# Altium footprint library Connector_PinHeader_2.00mm.PcbLib: 278 footprints (part 10 of 18)
Each footprint in its own frame and in the unit in brackets; x right, y up, seen from the top. Pads: shape width x height; smd on the part's side, far side on the other; paste and mask are expansions set on the pad; w line width, h text height; cw(c..) or ccw(c..) is an arc to the next point about the centre after c.
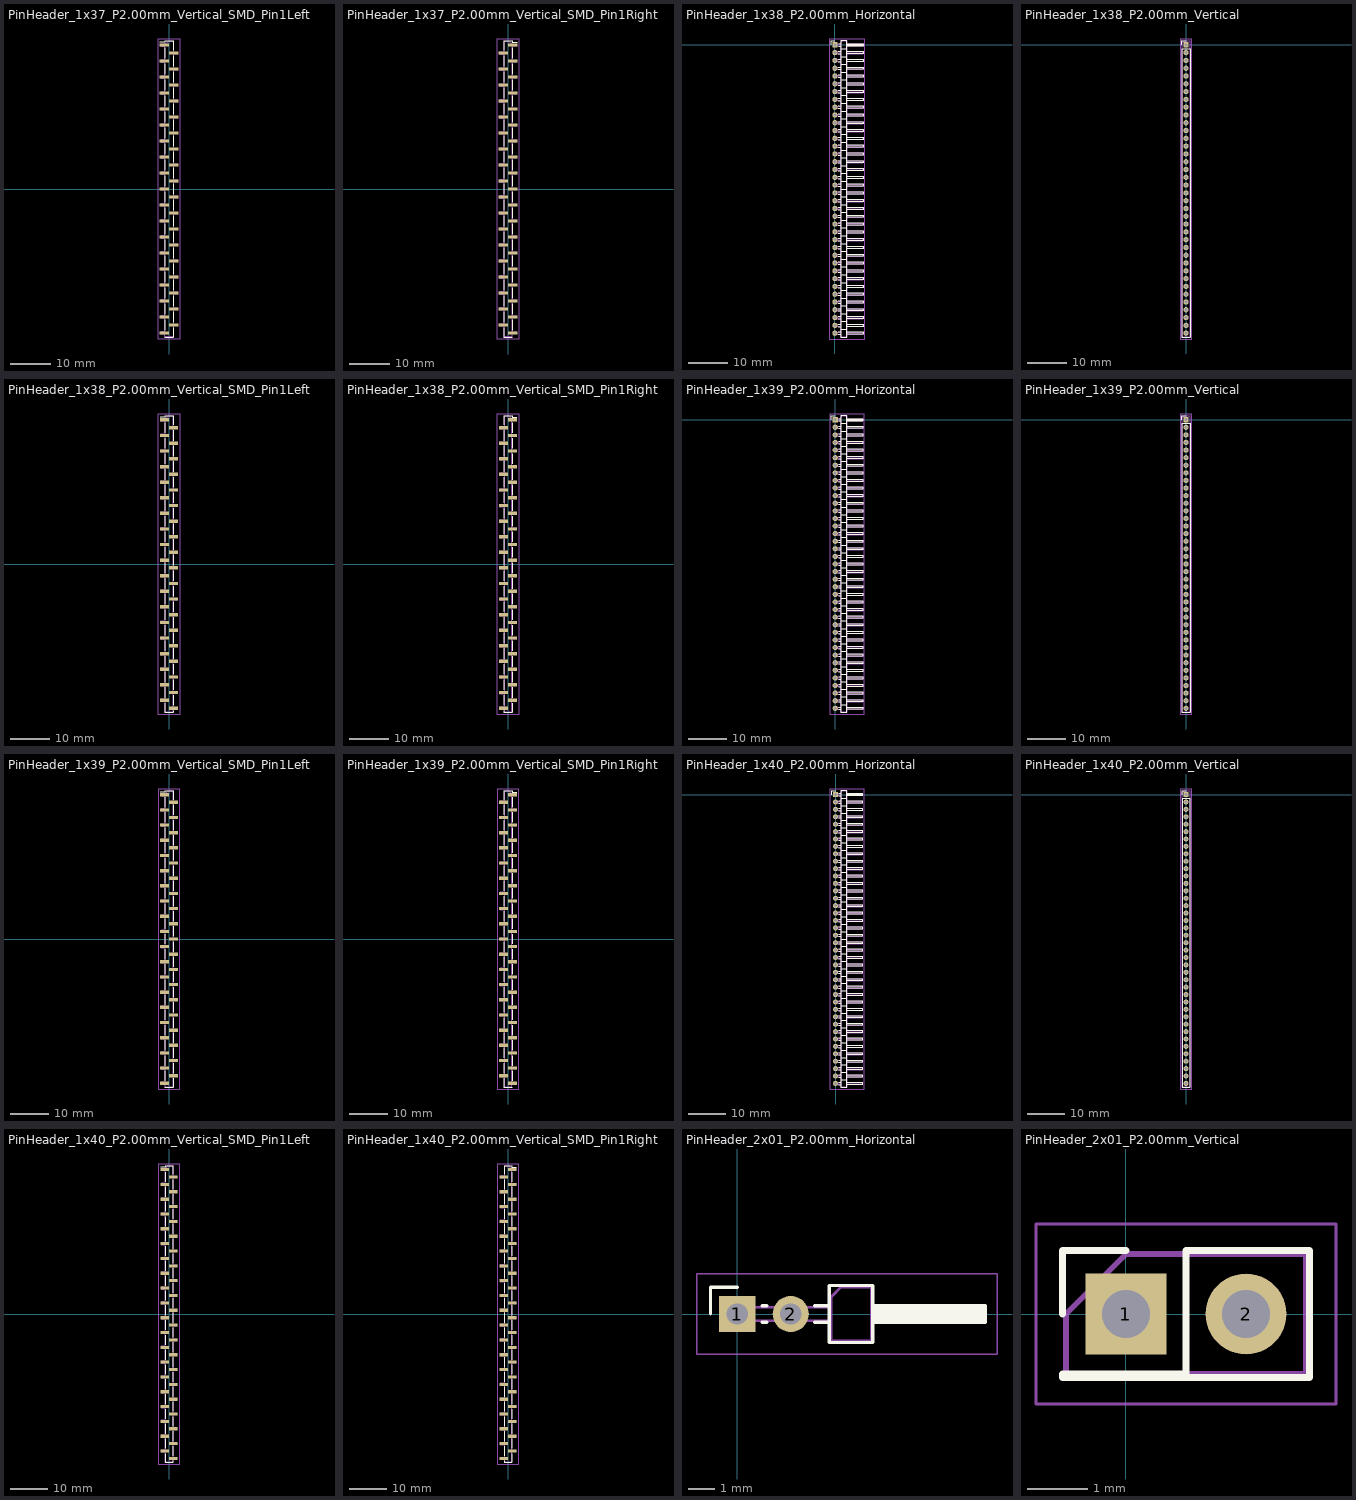
[diagram p9: the footprints below, top view; thin cyan lines are the x and y axes]

## PinHeader_1x37_P2.00mm_Vertical_SMD_Pin1Left [mm]
pads (37):
  rect 2.35x0.85 smd: 1(-1.175,36) 2(1.175,34) 3(-1.175,32) 4(1.175,30) 5(-1.175,28) 6(1.175,26) 7(-1.175,24) 8(1.175,22) 9(-1.175,20) 10(1.175,18) 11(-1.175,16) 12(1.175,14) 13(-1.175,12) 14(1.175,10) 15(-1.175,8) 16(1.175,6) 17(-1.175,4) 18(1.175,2) 19(-1.175,0) 20(1.175,-2) 21(-1.175,-4) 22(1.175,-6) 23(-1.175,-8) 24(1.175,-10) 25(-1.175,-12) 26(1.175,-14) 27(-1.175,-16) 28(1.175,-18) 29(-1.175,-20) 30(1.175,-22) 31(-1.175,-24) 32(1.175,-26) 33(-1.175,-28) 34(1.175,-30) 35(-1.175,-32) 36(1.175,-34) 37(-1.175,-36)
F.SilkS:
  lines w0.12: -2.29,36.685 -1.06,36.685 -1.06,37.06 1.06,37.06 1.06,34.685 ; -1.06,-37.06 1.06,-37.06 ; -1.06,-35.315 -1.06,-32.685 ; -1.06,-31.315 -1.06,-28.685 ; -1.06,-27.315 -1.06,-24.685 ; -1.06,-23.315 -1.06,-20.685 ; -1.06,-19.315 -1.06,-16.685 ; -1.06,-15.315 -1.06,-12.685 ; -1.06,-11.315 -1.06,-8.685 ; -1.06,-7.315 -1.06,-4.685 ; -1.06,-3.315 -1.06,-0.685 ; -1.06,0.685 -1.06,3.315 ; -1.06,4.685 -1.06,7.315 ; -1.06,8.685 -1.06,11.315 ; -1.06,12.685 -1.06,15.315 ; -1.06,16.685 -1.06,19.315 ; -1.06,20.685 -1.06,23.315 ; -1.06,24.685 -1.06,27.315 ; -1.06,28.685 -1.06,31.315 ; -1.06,32.685 -1.06,35.315 ; 1.06,-36.685 1.06,-37.06 ; 1.06,-34.685 1.06,-37.06 ; 1.06,-33.315 1.06,-30.685 ; 1.06,-29.315 1.06,-26.685 ; 1.06,-25.315 1.06,-22.685 ; 1.06,-21.315 1.06,-18.685 ; 1.06,-17.315 1.06,-14.685 ; 1.06,-13.315 1.06,-10.685 ; 1.06,-9.315 1.06,-6.685 ; 1.06,-5.315 1.06,-2.685 ; 1.06,-1.315 1.06,1.315 ; 1.06,2.685 1.06,5.315 ; 1.06,6.685 1.06,9.315 ; 1.06,10.685 1.06,13.315 ; 1.06,14.685 1.06,17.315 ; 1.06,18.685 1.06,21.315 ; 1.06,22.685 1.06,25.315 ; 1.06,26.685 1.06,29.315 ; 1.06,30.685 1.06,33.315
F.CrtYd:
  lines w0.05: -2.85,-37.5 -2.85,37.5 2.85,37.5 2.85,-37.5 -2.85,-37.5
F.Fab:
  lines w0.1: -1,-36.25 -2.1,-36.25 -2.1,-35.75 -1,-35.75 ; -1,-32.25 -2.1,-32.25 -2.1,-31.75 -1,-31.75 ; -1,-28.25 -2.1,-28.25 -2.1,-27.75 -1,-27.75 ; -1,-24.25 -2.1,-24.25 -2.1,-23.75 -1,-23.75 ; -1,-20.25 -2.1,-20.25 -2.1,-19.75 -1,-19.75 ; -1,-16.25 -2.1,-16.25 -2.1,-15.75 -1,-15.75 ; -1,-12.25 -2.1,-12.25 -2.1,-11.75 -1,-11.75 ; -1,-8.25 -2.1,-8.25 -2.1,-7.75 -1,-7.75 ; -1,-4.25 -2.1,-4.25 -2.1,-3.75 -1,-3.75 ; -1,-0.25 -2.1,-0.25 -2.1,0.25 -1,0.25 ; -1,3.75 -2.1,3.75 -2.1,4.25 -1,4.25 ; -1,7.75 -2.1,7.75 -2.1,8.25 -1,8.25 ; -1,11.75 -2.1,11.75 -2.1,12.25 -1,12.25 ; -1,15.75 -2.1,15.75 -2.1,16.25 -1,16.25 ; -1,19.75 -2.1,19.75 -2.1,20.25 -1,20.25 ; -1,23.75 -2.1,23.75 -2.1,24.25 -1,24.25 ; -1,27.75 -2.1,27.75 -2.1,28.25 -1,28.25 ; -1,31.75 -2.1,31.75 -2.1,32.25 -1,32.25 ; -1,35.75 -2.1,35.75 -2.1,36.25 -1,36.25 ; 1,-34.25 2.1,-34.25 2.1,-33.75 1,-33.75 ; 1,-30.25 2.1,-30.25 2.1,-29.75 1,-29.75 ; 1,-26.25 2.1,-26.25 2.1,-25.75 1,-25.75 ; 1,-22.25 2.1,-22.25 2.1,-21.75 1,-21.75 ; 1,-18.25 2.1,-18.25 2.1,-17.75 1,-17.75 ; 1,-14.25 2.1,-14.25 2.1,-13.75 1,-13.75 ; 1,-10.25 2.1,-10.25 2.1,-9.75 1,-9.75 ; 1,-6.25 2.1,-6.25 2.1,-5.75 1,-5.75 ; 1,-2.25 2.1,-2.25 2.1,-1.75 1,-1.75 ; 1,1.75 2.1,1.75 2.1,2.25 1,2.25 ; 1,5.75 2.1,5.75 2.1,6.25 1,6.25 ; 1,9.75 2.1,9.75 2.1,10.25 1,10.25 ; 1,13.75 2.1,13.75 2.1,14.25 1,14.25 ; 1,17.75 2.1,17.75 2.1,18.25 1,18.25 ; 1,21.75 2.1,21.75 2.1,22.25 1,22.25 ; 1,25.75 2.1,25.75 2.1,26.25 1,26.25 ; 1,29.75 2.1,29.75 2.1,30.25 1,30.25 ; 1,33.75 2.1,33.75 2.1,34.25 1,34.25 ; -1,36.25 -0.25,37 1,37 1,-37 -1,-37 -1,36.25
  text "'.Designator'" at 0.84,-4.047 h1

## PinHeader_1x37_P2.00mm_Vertical_SMD_Pin1Right [mm]
pads (37):
  rect 2.35x0.85 smd: 1(1.175,36) 2(-1.175,34) 3(1.175,32) 4(-1.175,30) 5(1.175,28) 6(-1.175,26) 7(1.175,24) 8(-1.175,22) 9(1.175,20) 10(-1.175,18) 11(1.175,16) 12(-1.175,14) 13(1.175,12) 14(-1.175,10) 15(1.175,8) 16(-1.175,6) 17(1.175,4) 18(-1.175,2) 19(1.175,0) 20(-1.175,-2) 21(1.175,-4) 22(-1.175,-6) 23(1.175,-8) 24(-1.175,-10) 25(1.175,-12) 26(-1.175,-14) 27(1.175,-16) 28(-1.175,-18) 29(1.175,-20) 30(-1.175,-22) 31(1.175,-24) 32(-1.175,-26) 33(1.175,-28) 34(-1.175,-30) 35(1.175,-32) 36(-1.175,-34) 37(1.175,-36)
F.SilkS:
  lines w0.12: -1.06,-36.685 -1.06,-37.06 ; -1.06,-34.685 -1.06,-37.06 ; -1.06,-33.315 -1.06,-30.685 ; -1.06,-29.315 -1.06,-26.685 ; -1.06,-25.315 -1.06,-22.685 ; -1.06,-21.315 -1.06,-18.685 ; -1.06,-17.315 -1.06,-14.685 ; -1.06,-13.315 -1.06,-10.685 ; -1.06,-9.315 -1.06,-6.685 ; -1.06,-5.315 -1.06,-2.685 ; -1.06,-1.315 -1.06,1.315 ; -1.06,2.685 -1.06,5.315 ; -1.06,6.685 -1.06,9.315 ; -1.06,10.685 -1.06,13.315 ; -1.06,14.685 -1.06,17.315 ; -1.06,18.685 -1.06,21.315 ; -1.06,22.685 -1.06,25.315 ; -1.06,26.685 -1.06,29.315 ; -1.06,30.685 -1.06,33.315 ; -1.06,34.685 -1.06,37.06 1.06,37.06 1.06,36.685 2.29,36.685 ; 1.06,-37.06 -1.06,-37.06 ; 1.06,-35.315 1.06,-32.685 ; 1.06,-31.315 1.06,-28.685 ; 1.06,-27.315 1.06,-24.685 ; 1.06,-23.315 1.06,-20.685 ; 1.06,-19.315 1.06,-16.685 ; 1.06,-15.315 1.06,-12.685 ; 1.06,-11.315 1.06,-8.685 ; 1.06,-7.315 1.06,-4.685 ; 1.06,-3.315 1.06,-0.685 ; 1.06,0.685 1.06,3.315 ; 1.06,4.685 1.06,7.315 ; 1.06,8.685 1.06,11.315 ; 1.06,12.685 1.06,15.315 ; 1.06,16.685 1.06,19.315 ; 1.06,20.685 1.06,23.315 ; 1.06,24.685 1.06,27.315 ; 1.06,28.685 1.06,31.315 ; 1.06,32.685 1.06,35.315
F.CrtYd:
  lines w0.05: -2.85,-37.5 2.85,-37.5 2.85,37.5 -2.85,37.5 -2.85,-37.5
F.Fab:
  lines w0.1: -1,-34.25 -2.1,-34.25 -2.1,-33.75 -1,-33.75 ; -1,-30.25 -2.1,-30.25 -2.1,-29.75 -1,-29.75 ; -1,-26.25 -2.1,-26.25 -2.1,-25.75 -1,-25.75 ; -1,-22.25 -2.1,-22.25 -2.1,-21.75 -1,-21.75 ; -1,-18.25 -2.1,-18.25 -2.1,-17.75 -1,-17.75 ; -1,-14.25 -2.1,-14.25 -2.1,-13.75 -1,-13.75 ; -1,-10.25 -2.1,-10.25 -2.1,-9.75 -1,-9.75 ; -1,-6.25 -2.1,-6.25 -2.1,-5.75 -1,-5.75 ; -1,-2.25 -2.1,-2.25 -2.1,-1.75 -1,-1.75 ; -1,1.75 -2.1,1.75 -2.1,2.25 -1,2.25 ; -1,5.75 -2.1,5.75 -2.1,6.25 -1,6.25 ; -1,9.75 -2.1,9.75 -2.1,10.25 -1,10.25 ; -1,13.75 -2.1,13.75 -2.1,14.25 -1,14.25 ; -1,17.75 -2.1,17.75 -2.1,18.25 -1,18.25 ; -1,21.75 -2.1,21.75 -2.1,22.25 -1,22.25 ; -1,25.75 -2.1,25.75 -2.1,26.25 -1,26.25 ; -1,29.75 -2.1,29.75 -2.1,30.25 -1,30.25 ; -1,33.75 -2.1,33.75 -2.1,34.25 -1,34.25 ; 1,-36.25 2.1,-36.25 2.1,-35.75 1,-35.75 ; 1,-32.25 2.1,-32.25 2.1,-31.75 1,-31.75 ; 1,-28.25 2.1,-28.25 2.1,-27.75 1,-27.75 ; 1,-24.25 2.1,-24.25 2.1,-23.75 1,-23.75 ; 1,-20.25 2.1,-20.25 2.1,-19.75 1,-19.75 ; 1,-16.25 2.1,-16.25 2.1,-15.75 1,-15.75 ; 1,-12.25 2.1,-12.25 2.1,-11.75 1,-11.75 ; 1,-8.25 2.1,-8.25 2.1,-7.75 1,-7.75 ; 1,-4.25 2.1,-4.25 2.1,-3.75 1,-3.75 ; 1,-0.25 2.1,-0.25 2.1,0.25 1,0.25 ; 1,3.75 2.1,3.75 2.1,4.25 1,4.25 ; 1,7.75 2.1,7.75 2.1,8.25 1,8.25 ; 1,11.75 2.1,11.75 2.1,12.25 1,12.25 ; 1,15.75 2.1,15.75 2.1,16.25 1,16.25 ; 1,19.75 2.1,19.75 2.1,20.25 1,20.25 ; 1,23.75 2.1,23.75 2.1,24.25 1,24.25 ; 1,27.75 2.1,27.75 2.1,28.25 1,28.25 ; 1,31.75 2.1,31.75 2.1,32.25 1,32.25 ; 1,35.75 2.1,35.75 2.1,36.25 1,36.25 ; 1,36.25 0.25,37 -1,37 -1,-37 1,-37 1,36.25
  text "'.Designator'" at 0.84,-4.047 h1

## PinHeader_1x38_P2.00mm_Horizontal [mm]
pads (38):
  rect 1.35x1.35 hole 0.8: 1(0,0)
  rrect100% 1.35x1.35 hole 0.8: 2(0,-2) 3(0,-4) 4(0,-6) 5(0,-8) 6(0,-10) 7(0,-12) 8(0,-14) 9(0,-16) 10(0,-18) 11(0,-20) 12(0,-22) 13(0,-24) 14(0,-26) 15(0,-28) 16(0,-30) 17(0,-32) 18(0,-34) 19(0,-36) 20(0,-38) 21(0,-40) 22(0,-42) 23(0,-44) 24(0,-46) 25(0,-48) 26(0,-50) 27(0,-52) 28(0,-54) 29(0,-56) 30(0,-58) 31(0,-60) 32(0,-62) 33(0,-64) 34(0,-66) 35(0,-68) 36(0,-70) 37(0,-72) 38(0,-74)
F.SilkS:
  drawing of 238 lines, arcs and shapes, not listed
F.CrtYd:
  lines w0.05: -1.5,-75.5 -1.5,1.5 7.7,1.5 7.7,-75.5 -1.5,-75.5
F.Fab:
  drawing of 233 lines, arcs and shapes, not listed
  text "'.Designator'" at 3.006,-40.642 h0.9

## PinHeader_1x38_P2.00mm_Vertical [mm]
pads (38):
  rect 1.35x1.35 hole 0.8: 1(0,0)
  rrect100% 1.35x1.35 hole 0.8: 2(0,-2) 3(0,-4) 4(0,-6) 5(0,-8) 6(0,-10) 7(0,-12) 8(0,-14) 9(0,-16) 10(0,-18) 11(0,-20) 12(0,-22) 13(0,-24) 14(0,-26) 15(0,-28) 16(0,-30) 17(0,-32) 18(0,-34) 19(0,-36) 20(0,-38) 21(0,-40) 22(0,-42) 23(0,-44) 24(0,-46) 25(0,-48) 26(0,-50) 27(0,-52) 28(0,-54) 29(0,-56) 30(0,-58) 31(0,-60) 32(0,-62) 33(0,-64) 34(0,-66) 35(0,-68) 36(0,-70) 37(0,-72) 38(0,-74)
F.SilkS:
  lines w0.12: -1.06,0 -1.06,1.06 0,1.06 ; -1.06,-75.06 1.06,-75.06 1.06,-1 -1.06,-1 -1.06,-75.06
F.CrtYd:
  lines w0.05: -1.5,-75.5 1.5,-75.5 1.5,1.5 -1.5,1.5 -1.5,-75.5
F.Fab:
  lines w0.1: -1,-75 1,-75 1,1 -0.5,1 -1,0.5 -1,-75
  text "'.Designator'" at 0.84,-41.047 h1

## PinHeader_1x38_P2.00mm_Vertical_SMD_Pin1Left [mm]
pads (38):
  rect 2.35x0.85 smd: 1(-1.175,37) 2(1.175,35) 3(-1.175,33) 4(1.175,31) 5(-1.175,29) 6(1.175,27) 7(-1.175,25) 8(1.175,23) 9(-1.175,21) 10(1.175,19) 11(-1.175,17) 12(1.175,15) 13(-1.175,13) 14(1.175,11) 15(-1.175,9) 16(1.175,7) 17(-1.175,5) 18(1.175,3) 19(-1.175,1) 20(1.175,-1) 21(-1.175,-3) 22(1.175,-5) 23(-1.175,-7) 24(1.175,-9) 25(-1.175,-11) 26(1.175,-13) 27(-1.175,-15) 28(1.175,-17) 29(-1.175,-19) 30(1.175,-21) 31(-1.175,-23) 32(1.175,-25) 33(-1.175,-27) 34(1.175,-29) 35(-1.175,-31) 36(1.175,-33) 37(-1.175,-35) 38(1.175,-37)
F.SilkS:
  lines w0.12: -2.29,37.685 -1.06,37.685 -1.06,38.06 1.06,38.06 1.06,35.685 ; -1.06,-35.685 -1.06,-38.06 1.06,-38.06 1.06,-37.685 ; -1.06,-34.315 -1.06,-31.685 ; -1.06,-30.315 -1.06,-27.685 ; -1.06,-26.315 -1.06,-23.685 ; -1.06,-22.315 -1.06,-19.685 ; -1.06,-18.315 -1.06,-15.685 ; -1.06,-14.315 -1.06,-11.685 ; -1.06,-10.315 -1.06,-7.685 ; -1.06,-6.315 -1.06,-3.685 ; -1.06,-2.315 -1.06,0.315 ; -1.06,1.685 -1.06,4.315 ; -1.06,5.685 -1.06,8.315 ; -1.06,9.685 -1.06,12.315 ; -1.06,13.685 -1.06,16.315 ; -1.06,17.685 -1.06,20.315 ; -1.06,21.685 -1.06,24.315 ; -1.06,25.685 -1.06,28.315 ; -1.06,29.685 -1.06,32.315 ; -1.06,33.685 -1.06,36.315 ; 1.06,-36.315 1.06,-33.685 ; 1.06,-32.315 1.06,-29.685 ; 1.06,-28.315 1.06,-25.685 ; 1.06,-24.315 1.06,-21.685 ; 1.06,-20.315 1.06,-17.685 ; 1.06,-16.315 1.06,-13.685 ; 1.06,-12.315 1.06,-9.685 ; 1.06,-8.315 1.06,-5.685 ; 1.06,-4.315 1.06,-1.685 ; 1.06,-0.315 1.06,2.315 ; 1.06,3.685 1.06,6.315 ; 1.06,7.685 1.06,10.315 ; 1.06,11.685 1.06,14.315 ; 1.06,15.685 1.06,18.315 ; 1.06,19.685 1.06,22.315 ; 1.06,23.685 1.06,26.315 ; 1.06,27.685 1.06,30.315 ; 1.06,31.685 1.06,34.315
F.CrtYd:
  lines w0.05: -2.85,-38.5 -2.85,38.5 2.85,38.5 2.85,-38.5 -2.85,-38.5
F.Fab:
  lines w0.1: -1,-35.25 -2.1,-35.25 -2.1,-34.75 -1,-34.75 ; -1,-31.25 -2.1,-31.25 -2.1,-30.75 -1,-30.75 ; -1,-27.25 -2.1,-27.25 -2.1,-26.75 -1,-26.75 ; -1,-23.25 -2.1,-23.25 -2.1,-22.75 -1,-22.75 ; -1,-19.25 -2.1,-19.25 -2.1,-18.75 -1,-18.75 ; -1,-15.25 -2.1,-15.25 -2.1,-14.75 -1,-14.75 ; -1,-11.25 -2.1,-11.25 -2.1,-10.75 -1,-10.75 ; -1,-7.25 -2.1,-7.25 -2.1,-6.75 -1,-6.75 ; -1,-3.25 -2.1,-3.25 -2.1,-2.75 -1,-2.75 ; -1,0.75 -2.1,0.75 -2.1,1.25 -1,1.25 ; -1,4.75 -2.1,4.75 -2.1,5.25 -1,5.25 ; -1,8.75 -2.1,8.75 -2.1,9.25 -1,9.25 ; -1,12.75 -2.1,12.75 -2.1,13.25 -1,13.25 ; -1,16.75 -2.1,16.75 -2.1,17.25 -1,17.25 ; -1,20.75 -2.1,20.75 -2.1,21.25 -1,21.25 ; -1,24.75 -2.1,24.75 -2.1,25.25 -1,25.25 ; -1,28.75 -2.1,28.75 -2.1,29.25 -1,29.25 ; -1,32.75 -2.1,32.75 -2.1,33.25 -1,33.25 ; -1,36.75 -2.1,36.75 -2.1,37.25 -1,37.25 ; 1,-37.25 2.1,-37.25 2.1,-36.75 1,-36.75 ; 1,-33.25 2.1,-33.25 2.1,-32.75 1,-32.75 ; 1,-29.25 2.1,-29.25 2.1,-28.75 1,-28.75 ; 1,-25.25 2.1,-25.25 2.1,-24.75 1,-24.75 ; 1,-21.25 2.1,-21.25 2.1,-20.75 1,-20.75 ; 1,-17.25 2.1,-17.25 2.1,-16.75 1,-16.75 ; 1,-13.25 2.1,-13.25 2.1,-12.75 1,-12.75 ; 1,-9.25 2.1,-9.25 2.1,-8.75 1,-8.75 ; 1,-5.25 2.1,-5.25 2.1,-4.75 1,-4.75 ; 1,-1.25 2.1,-1.25 2.1,-0.75 1,-0.75 ; 1,2.75 2.1,2.75 2.1,3.25 1,3.25 ; 1,6.75 2.1,6.75 2.1,7.25 1,7.25 ; 1,10.75 2.1,10.75 2.1,11.25 1,11.25 ; 1,14.75 2.1,14.75 2.1,15.25 1,15.25 ; 1,18.75 2.1,18.75 2.1,19.25 1,19.25 ; 1,22.75 2.1,22.75 2.1,23.25 1,23.25 ; 1,26.75 2.1,26.75 2.1,27.25 1,27.25 ; 1,30.75 2.1,30.75 2.1,31.25 1,31.25 ; 1,34.75 2.1,34.75 2.1,35.25 1,35.25 ; -1,37.25 -1,-38 1,-38 1,38 -0.25,38 -1,37.25
  text "'.Designator'" at 0.84,-4.047 h1

## PinHeader_1x38_P2.00mm_Vertical_SMD_Pin1Right [mm]
pads (38):
  rect 2.35x0.85 smd: 1(1.175,37) 2(-1.175,35) 3(1.175,33) 4(-1.175,31) 5(1.175,29) 6(-1.175,27) 7(1.175,25) 8(-1.175,23) 9(1.175,21) 10(-1.175,19) 11(1.175,17) 12(-1.175,15) 13(1.175,13) 14(-1.175,11) 15(1.175,9) 16(-1.175,7) 17(1.175,5) 18(-1.175,3) 19(1.175,1) 20(-1.175,-1) 21(1.175,-3) 22(-1.175,-5) 23(1.175,-7) 24(-1.175,-9) 25(1.175,-11) 26(-1.175,-13) 27(1.175,-15) 28(-1.175,-17) 29(1.175,-19) 30(-1.175,-21) 31(1.175,-23) 32(-1.175,-25) 33(1.175,-27) 34(-1.175,-29) 35(1.175,-31) 36(-1.175,-33) 37(1.175,-35) 38(-1.175,-37)
F.SilkS:
  lines w0.12: -1.06,-37.685 -1.06,-38.06 1.06,-38.06 1.06,-35.685 ; -1.06,-36.315 -1.06,-33.685 ; -1.06,-32.315 -1.06,-29.685 ; -1.06,-28.315 -1.06,-25.685 ; -1.06,-24.315 -1.06,-21.685 ; -1.06,-20.315 -1.06,-17.685 ; -1.06,-16.315 -1.06,-13.685 ; -1.06,-12.315 -1.06,-9.685 ; -1.06,-8.315 -1.06,-5.685 ; -1.06,-4.315 -1.06,-1.685 ; -1.06,-0.315 -1.06,2.315 ; -1.06,3.685 -1.06,6.315 ; -1.06,7.685 -1.06,10.315 ; -1.06,11.685 -1.06,14.315 ; -1.06,15.685 -1.06,18.315 ; -1.06,19.685 -1.06,22.315 ; -1.06,23.685 -1.06,26.315 ; -1.06,27.685 -1.06,30.315 ; -1.06,31.685 -1.06,34.315 ; -1.06,35.685 -1.06,38.06 1.06,38.06 1.06,37.685 2.29,37.685 ; 1.06,-34.315 1.06,-31.685 ; 1.06,-30.315 1.06,-27.685 ; 1.06,-26.315 1.06,-23.685 ; 1.06,-22.315 1.06,-19.685 ; 1.06,-18.315 1.06,-15.685 ; 1.06,-14.315 1.06,-11.685 ; 1.06,-10.315 1.06,-7.685 ; 1.06,-6.315 1.06,-3.685 ; 1.06,-2.315 1.06,0.315 ; 1.06,1.685 1.06,4.315 ; 1.06,5.685 1.06,8.315 ; 1.06,9.685 1.06,12.315 ; 1.06,13.685 1.06,16.315 ; 1.06,17.685 1.06,20.315 ; 1.06,21.685 1.06,24.315 ; 1.06,25.685 1.06,28.315 ; 1.06,29.685 1.06,32.315 ; 1.06,33.685 1.06,36.315
F.CrtYd:
  lines w0.05: -2.85,-38.5 -2.85,38.5 2.85,38.5 2.85,-38.5 -2.85,-38.5
F.Fab:
  lines w0.1: -1,-37.25 -2.1,-37.25 -2.1,-36.75 -1,-36.75 ; -1,-33.25 -2.1,-33.25 -2.1,-32.75 -1,-32.75 ; -1,-29.25 -2.1,-29.25 -2.1,-28.75 -1,-28.75 ; -1,-25.25 -2.1,-25.25 -2.1,-24.75 -1,-24.75 ; -1,-21.25 -2.1,-21.25 -2.1,-20.75 -1,-20.75 ; -1,-17.25 -2.1,-17.25 -2.1,-16.75 -1,-16.75 ; -1,-13.25 -2.1,-13.25 -2.1,-12.75 -1,-12.75 ; -1,-9.25 -2.1,-9.25 -2.1,-8.75 -1,-8.75 ; -1,-5.25 -2.1,-5.25 -2.1,-4.75 -1,-4.75 ; -1,-1.25 -2.1,-1.25 -2.1,-0.75 -1,-0.75 ; -1,2.75 -2.1,2.75 -2.1,3.25 -1,3.25 ; -1,6.75 -2.1,6.75 -2.1,7.25 -1,7.25 ; -1,10.75 -2.1,10.75 -2.1,11.25 -1,11.25 ; -1,14.75 -2.1,14.75 -2.1,15.25 -1,15.25 ; -1,18.75 -2.1,18.75 -2.1,19.25 -1,19.25 ; -1,22.75 -2.1,22.75 -2.1,23.25 -1,23.25 ; -1,26.75 -2.1,26.75 -2.1,27.25 -1,27.25 ; -1,30.75 -2.1,30.75 -2.1,31.25 -1,31.25 ; -1,34.75 -2.1,34.75 -2.1,35.25 -1,35.25 ; 1,-35.25 2.1,-35.25 2.1,-34.75 1,-34.75 ; 1,-31.25 2.1,-31.25 2.1,-30.75 1,-30.75 ; 1,-27.25 2.1,-27.25 2.1,-26.75 1,-26.75 ; 1,-23.25 2.1,-23.25 2.1,-22.75 1,-22.75 ; 1,-19.25 2.1,-19.25 2.1,-18.75 1,-18.75 ; 1,-15.25 2.1,-15.25 2.1,-14.75 1,-14.75 ; 1,-11.25 2.1,-11.25 2.1,-10.75 1,-10.75 ; 1,-7.25 2.1,-7.25 2.1,-6.75 1,-6.75 ; 1,-3.25 2.1,-3.25 2.1,-2.75 1,-2.75 ; 1,0.75 2.1,0.75 2.1,1.25 1,1.25 ; 1,4.75 2.1,4.75 2.1,5.25 1,5.25 ; 1,8.75 2.1,8.75 2.1,9.25 1,9.25 ; 1,12.75 2.1,12.75 2.1,13.25 1,13.25 ; 1,16.75 2.1,16.75 2.1,17.25 1,17.25 ; 1,20.75 2.1,20.75 2.1,21.25 1,21.25 ; 1,24.75 2.1,24.75 2.1,25.25 1,25.25 ; 1,28.75 2.1,28.75 2.1,29.25 1,29.25 ; 1,32.75 2.1,32.75 2.1,33.25 1,33.25 ; 1,36.75 2.1,36.75 2.1,37.25 1,37.25 ; 1,37.25 1,-38 -1,-38 -1,38 0.25,38 1,37.25
  text "'.Designator'" at 0.84,-4.047 h1

## PinHeader_1x39_P2.00mm_Horizontal [mm]
pads (39):
  rect 1.35x1.35 hole 0.8: 1(0,0)
  rrect100% 1.35x1.35 hole 0.8: 2(0,-2) 3(0,-4) 4(0,-6) 5(0,-8) 6(0,-10) 7(0,-12) 8(0,-14) 9(0,-16) 10(0,-18) 11(0,-20) 12(0,-22) 13(0,-24) 14(0,-26) 15(0,-28) 16(0,-30) 17(0,-32) 18(0,-34) 19(0,-36) 20(0,-38) 21(0,-40) 22(0,-42) 23(0,-44) 24(0,-46) 25(0,-48) 26(0,-50) 27(0,-52) 28(0,-54) 29(0,-56) 30(0,-58) 31(0,-60) 32(0,-62) 33(0,-64) 34(0,-66) 35(0,-68) 36(0,-70) 37(0,-72) 38(0,-74) 39(0,-76)
F.SilkS:
  drawing of 244 lines, arcs and shapes, not listed
F.CrtYd:
  lines w0.05: -1.5,-77.5 -1.5,1.5 7.7,1.5 7.7,-77.5 -1.5,-77.5
F.Fab:
  drawing of 239 lines, arcs and shapes, not listed
  text "'.Designator'" at 3.006,-41.642 h0.9

## PinHeader_1x39_P2.00mm_Vertical [mm]
pads (39):
  rect 1.35x1.35 hole 0.8: 1(0,0)
  rrect100% 1.35x1.35 hole 0.8: 2(0,-2) 3(0,-4) 4(0,-6) 5(0,-8) 6(0,-10) 7(0,-12) 8(0,-14) 9(0,-16) 10(0,-18) 11(0,-20) 12(0,-22) 13(0,-24) 14(0,-26) 15(0,-28) 16(0,-30) 17(0,-32) 18(0,-34) 19(0,-36) 20(0,-38) 21(0,-40) 22(0,-42) 23(0,-44) 24(0,-46) 25(0,-48) 26(0,-50) 27(0,-52) 28(0,-54) 29(0,-56) 30(0,-58) 31(0,-60) 32(0,-62) 33(0,-64) 34(0,-66) 35(0,-68) 36(0,-70) 37(0,-72) 38(0,-74) 39(0,-76)
F.SilkS:
  lines w0.12: -1.06,0 -1.06,1.06 0,1.06 ; -1.06,-77.06 -1.06,-1 1.06,-1 1.06,-77.06 -1.06,-77.06
F.CrtYd:
  lines w0.05: -1.5,-77.5 1.5,-77.5 1.5,1.5 -1.5,1.5 -1.5,-77.5
F.Fab:
  lines w0.1: -1,-77 -1,0.5 -0.5,1 1,1 1,-77 -1,-77
  text "'.Designator'" at 0.84,-42.047 h1

## PinHeader_1x39_P2.00mm_Vertical_SMD_Pin1Left [mm]
pads (39):
  rect 2.35x0.85 smd: 1(-1.175,38) 2(1.175,36) 3(-1.175,34) 4(1.175,32) 5(-1.175,30) 6(1.175,28) 7(-1.175,26) 8(1.175,24) 9(-1.175,22) 10(1.175,20) 11(-1.175,18) 12(1.175,16) 13(-1.175,14) 14(1.175,12) 15(-1.175,10) 16(1.175,8) 17(-1.175,6) 18(1.175,4) 19(-1.175,2) 20(1.175,0) 21(-1.175,-2) 22(1.175,-4) 23(-1.175,-6) 24(1.175,-8) 25(-1.175,-10) 26(1.175,-12) 27(-1.175,-14) 28(1.175,-16) 29(-1.175,-18) 30(1.175,-20) 31(-1.175,-22) 32(1.175,-24) 33(-1.175,-26) 34(1.175,-28) 35(-1.175,-30) 36(1.175,-32) 37(-1.175,-34) 38(1.175,-36) 39(-1.175,-38)
F.SilkS:
  lines w0.12: -2.29,38.685 -1.06,38.685 -1.06,39.06 1.06,39.06 1.06,36.685 ; -1.06,-39.06 1.06,-39.06 ; -1.06,-37.315 -1.06,-34.685 ; -1.06,-33.315 -1.06,-30.685 ; -1.06,-29.315 -1.06,-26.685 ; -1.06,-25.315 -1.06,-22.685 ; -1.06,-21.315 -1.06,-18.685 ; -1.06,-17.315 -1.06,-14.685 ; -1.06,-13.315 -1.06,-10.685 ; -1.06,-9.315 -1.06,-6.685 ; -1.06,-5.315 -1.06,-2.685 ; -1.06,-1.315 -1.06,1.315 ; -1.06,2.685 -1.06,5.315 ; -1.06,6.685 -1.06,9.315 ; -1.06,10.685 -1.06,13.315 ; -1.06,14.685 -1.06,17.315 ; -1.06,18.685 -1.06,21.315 ; -1.06,22.685 -1.06,25.315 ; -1.06,26.685 -1.06,29.315 ; -1.06,30.685 -1.06,33.315 ; -1.06,34.685 -1.06,37.315 ; 1.06,-38.685 1.06,-39.06 ; 1.06,-36.685 1.06,-39.06 ; 1.06,-35.315 1.06,-32.685 ; 1.06,-31.315 1.06,-28.685 ; 1.06,-27.315 1.06,-24.685 ; 1.06,-23.315 1.06,-20.685 ; 1.06,-19.315 1.06,-16.685 ; 1.06,-15.315 1.06,-12.685 ; 1.06,-11.315 1.06,-8.685 ; 1.06,-7.315 1.06,-4.685 ; 1.06,-3.315 1.06,-0.685 ; 1.06,0.685 1.06,3.315 ; 1.06,4.685 1.06,7.315 ; 1.06,8.685 1.06,11.315 ; 1.06,12.685 1.06,15.315 ; 1.06,16.685 1.06,19.315 ; 1.06,20.685 1.06,23.315 ; 1.06,24.685 1.06,27.315 ; 1.06,28.685 1.06,31.315 ; 1.06,32.685 1.06,35.315
F.CrtYd:
  lines w0.05: -2.85,-39.5 2.85,-39.5 2.85,39.5 -2.85,39.5 -2.85,-39.5
F.Fab:
  lines w0.1: -1,-38.25 -2.1,-38.25 -2.1,-37.75 -1,-37.75 ; -1,-34.25 -2.1,-34.25 -2.1,-33.75 -1,-33.75 ; -1,-30.25 -2.1,-30.25 -2.1,-29.75 -1,-29.75 ; -1,-26.25 -2.1,-26.25 -2.1,-25.75 -1,-25.75 ; -1,-22.25 -2.1,-22.25 -2.1,-21.75 -1,-21.75 ; -1,-18.25 -2.1,-18.25 -2.1,-17.75 -1,-17.75 ; -1,-14.25 -2.1,-14.25 -2.1,-13.75 -1,-13.75 ; -1,-10.25 -2.1,-10.25 -2.1,-9.75 -1,-9.75 ; -1,-6.25 -2.1,-6.25 -2.1,-5.75 -1,-5.75 ; -1,-2.25 -2.1,-2.25 -2.1,-1.75 -1,-1.75 ; -1,1.75 -2.1,1.75 -2.1,2.25 -1,2.25 ; -1,5.75 -2.1,5.75 -2.1,6.25 -1,6.25 ; -1,9.75 -2.1,9.75 -2.1,10.25 -1,10.25 ; -1,13.75 -2.1,13.75 -2.1,14.25 -1,14.25 ; -1,17.75 -2.1,17.75 -2.1,18.25 -1,18.25 ; -1,21.75 -2.1,21.75 -2.1,22.25 -1,22.25 ; -1,25.75 -2.1,25.75 -2.1,26.25 -1,26.25 ; -1,29.75 -2.1,29.75 -2.1,30.25 -1,30.25 ; -1,33.75 -2.1,33.75 -2.1,34.25 -1,34.25 ; -1,37.75 -2.1,37.75 -2.1,38.25 -1,38.25 ; 1,-36.25 2.1,-36.25 2.1,-35.75 1,-35.75 ; 1,-32.25 2.1,-32.25 2.1,-31.75 1,-31.75 ; 1,-28.25 2.1,-28.25 2.1,-27.75 1,-27.75 ; 1,-24.25 2.1,-24.25 2.1,-23.75 1,-23.75 ; 1,-20.25 2.1,-20.25 2.1,-19.75 1,-19.75 ; 1,-16.25 2.1,-16.25 2.1,-15.75 1,-15.75 ; 1,-12.25 2.1,-12.25 2.1,-11.75 1,-11.75 ; 1,-8.25 2.1,-8.25 2.1,-7.75 1,-7.75 ; 1,-4.25 2.1,-4.25 2.1,-3.75 1,-3.75 ; 1,-0.25 2.1,-0.25 2.1,0.25 1,0.25 ; 1,3.75 2.1,3.75 2.1,4.25 1,4.25 ; 1,7.75 2.1,7.75 2.1,8.25 1,8.25 ; 1,11.75 2.1,11.75 2.1,12.25 1,12.25 ; 1,15.75 2.1,15.75 2.1,16.25 1,16.25 ; 1,19.75 2.1,19.75 2.1,20.25 1,20.25 ; 1,23.75 2.1,23.75 2.1,24.25 1,24.25 ; 1,27.75 2.1,27.75 2.1,28.25 1,28.25 ; 1,31.75 2.1,31.75 2.1,32.25 1,32.25 ; 1,35.75 2.1,35.75 2.1,36.25 1,36.25 ; -1,38.25 -1,-39 1,-39 1,39 -0.25,39 -1,38.25
  text "'.Designator'" at 0.84,-4.047 h1

## PinHeader_1x39_P2.00mm_Vertical_SMD_Pin1Right [mm]
pads (39):
  rect 2.35x0.85 smd: 1(1.175,38) 2(-1.175,36) 3(1.175,34) 4(-1.175,32) 5(1.175,30) 6(-1.175,28) 7(1.175,26) 8(-1.175,24) 9(1.175,22) 10(-1.175,20) 11(1.175,18) 12(-1.175,16) 13(1.175,14) 14(-1.175,12) 15(1.175,10) 16(-1.175,8) 17(1.175,6) 18(-1.175,4) 19(1.175,2) 20(-1.175,0) 21(1.175,-2) 22(-1.175,-4) 23(1.175,-6) 24(-1.175,-8) 25(1.175,-10) 26(-1.175,-12) 27(1.175,-14) 28(-1.175,-16) 29(1.175,-18) 30(-1.175,-20) 31(1.175,-22) 32(-1.175,-24) 33(1.175,-26) 34(-1.175,-28) 35(1.175,-30) 36(-1.175,-32) 37(1.175,-34) 38(-1.175,-36) 39(1.175,-38)
F.SilkS:
  lines w0.12: -1.06,-38.685 -1.06,-39.06 ; -1.06,-36.685 -1.06,-39.06 ; -1.06,-35.315 -1.06,-32.685 ; -1.06,-31.315 -1.06,-28.685 ; -1.06,-27.315 -1.06,-24.685 ; -1.06,-23.315 -1.06,-20.685 ; -1.06,-19.315 -1.06,-16.685 ; -1.06,-15.315 -1.06,-12.685 ; -1.06,-11.315 -1.06,-8.685 ; -1.06,-7.315 -1.06,-4.685 ; -1.06,-3.315 -1.06,-0.685 ; -1.06,0.685 -1.06,3.315 ; -1.06,4.685 -1.06,7.315 ; -1.06,8.685 -1.06,11.315 ; -1.06,12.685 -1.06,15.315 ; -1.06,16.685 -1.06,19.315 ; -1.06,20.685 -1.06,23.315 ; -1.06,24.685 -1.06,27.315 ; -1.06,28.685 -1.06,31.315 ; -1.06,32.685 -1.06,35.315 ; -1.06,36.685 -1.06,39.06 1.06,39.06 1.06,38.685 2.29,38.685 ; 1.06,-39.06 -1.06,-39.06 ; 1.06,-37.315 1.06,-34.685 ; 1.06,-33.315 1.06,-30.685 ; 1.06,-29.315 1.06,-26.685 ; 1.06,-25.315 1.06,-22.685 ; 1.06,-21.315 1.06,-18.685 ; 1.06,-17.315 1.06,-14.685 ; 1.06,-13.315 1.06,-10.685 ; 1.06,-9.315 1.06,-6.685 ; 1.06,-5.315 1.06,-2.685 ; 1.06,-1.315 1.06,1.315 ; 1.06,2.685 1.06,5.315 ; 1.06,6.685 1.06,9.315 ; 1.06,10.685 1.06,13.315 ; 1.06,14.685 1.06,17.315 ; 1.06,18.685 1.06,21.315 ; 1.06,22.685 1.06,25.315 ; 1.06,26.685 1.06,29.315 ; 1.06,30.685 1.06,33.315 ; 1.06,34.685 1.06,37.315
F.CrtYd:
  lines w0.05: -2.85,-39.5 -2.85,39.5 2.85,39.5 2.85,-39.5 -2.85,-39.5
F.Fab:
  lines w0.1: -1,-36.25 -2.1,-36.25 -2.1,-35.75 -1,-35.75 ; -1,-32.25 -2.1,-32.25 -2.1,-31.75 -1,-31.75 ; -1,-28.25 -2.1,-28.25 -2.1,-27.75 -1,-27.75 ; -1,-24.25 -2.1,-24.25 -2.1,-23.75 -1,-23.75 ; -1,-20.25 -2.1,-20.25 -2.1,-19.75 -1,-19.75 ; -1,-16.25 -2.1,-16.25 -2.1,-15.75 -1,-15.75 ; -1,-12.25 -2.1,-12.25 -2.1,-11.75 -1,-11.75 ; -1,-8.25 -2.1,-8.25 -2.1,-7.75 -1,-7.75 ; -1,-4.25 -2.1,-4.25 -2.1,-3.75 -1,-3.75 ; -1,-0.25 -2.1,-0.25 -2.1,0.25 -1,0.25 ; -1,3.75 -2.1,3.75 -2.1,4.25 -1,4.25 ; -1,7.75 -2.1,7.75 -2.1,8.25 -1,8.25 ; -1,11.75 -2.1,11.75 -2.1,12.25 -1,12.25 ; -1,15.75 -2.1,15.75 -2.1,16.25 -1,16.25 ; -1,19.75 -2.1,19.75 -2.1,20.25 -1,20.25 ; -1,23.75 -2.1,23.75 -2.1,24.25 -1,24.25 ; -1,27.75 -2.1,27.75 -2.1,28.25 -1,28.25 ; -1,31.75 -2.1,31.75 -2.1,32.25 -1,32.25 ; -1,35.75 -2.1,35.75 -2.1,36.25 -1,36.25 ; 1,-38.25 2.1,-38.25 2.1,-37.75 1,-37.75 ; 1,-34.25 2.1,-34.25 2.1,-33.75 1,-33.75 ; 1,-30.25 2.1,-30.25 2.1,-29.75 1,-29.75 ; 1,-26.25 2.1,-26.25 2.1,-25.75 1,-25.75 ; 1,-22.25 2.1,-22.25 2.1,-21.75 1,-21.75 ; 1,-18.25 2.1,-18.25 2.1,-17.75 1,-17.75 ; 1,-14.25 2.1,-14.25 2.1,-13.75 1,-13.75 ; 1,-10.25 2.1,-10.25 2.1,-9.75 1,-9.75 ; 1,-6.25 2.1,-6.25 2.1,-5.75 1,-5.75 ; 1,-2.25 2.1,-2.25 2.1,-1.75 1,-1.75 ; 1,1.75 2.1,1.75 2.1,2.25 1,2.25 ; 1,5.75 2.1,5.75 2.1,6.25 1,6.25 ; 1,9.75 2.1,9.75 2.1,10.25 1,10.25 ; 1,13.75 2.1,13.75 2.1,14.25 1,14.25 ; 1,17.75 2.1,17.75 2.1,18.25 1,18.25 ; 1,21.75 2.1,21.75 2.1,22.25 1,22.25 ; 1,25.75 2.1,25.75 2.1,26.25 1,26.25 ; 1,29.75 2.1,29.75 2.1,30.25 1,30.25 ; 1,33.75 2.1,33.75 2.1,34.25 1,34.25 ; 1,37.75 2.1,37.75 2.1,38.25 1,38.25 ; 1,38.25 0.25,39 -1,39 -1,-39 1,-39 1,38.25
  text "'.Designator'" at 0.84,-4.047 h1

## PinHeader_1x40_P2.00mm_Horizontal [mm]
pads (40):
  rect 1.35x1.35 hole 0.8: 1(0,0)
  rrect100% 1.35x1.35 hole 0.8: 2(0,-2) 3(0,-4) 4(0,-6) 5(0,-8) 6(0,-10) 7(0,-12) 8(0,-14) 9(0,-16) 10(0,-18) 11(0,-20) 12(0,-22) 13(0,-24) 14(0,-26) 15(0,-28) 16(0,-30) 17(0,-32) 18(0,-34) 19(0,-36) 20(0,-38) 21(0,-40) 22(0,-42) 23(0,-44) 24(0,-46) 25(0,-48) 26(0,-50) 27(0,-52) 28(0,-54) 29(0,-56) 30(0,-58) 31(0,-60) 32(0,-62) 33(0,-64) 34(0,-66) 35(0,-68) 36(0,-70) 37(0,-72) 38(0,-74) 39(0,-76) 40(0,-78)
F.SilkS:
  drawing of 250 lines, arcs and shapes, not listed
F.CrtYd:
  lines w0.05: -1.5,-79.5 7.7,-79.5 7.7,1.5 -1.5,1.5 -1.5,-79.5
F.Fab:
  drawing of 245 lines, arcs and shapes, not listed
  text "'.Designator'" at 3.006,-42.642 h0.9

## PinHeader_1x40_P2.00mm_Vertical [mm]
pads (40):
  rect 1.35x1.35 hole 0.8: 1(0,0)
  rrect100% 1.35x1.35 hole 0.8: 2(0,-2) 3(0,-4) 4(0,-6) 5(0,-8) 6(0,-10) 7(0,-12) 8(0,-14) 9(0,-16) 10(0,-18) 11(0,-20) 12(0,-22) 13(0,-24) 14(0,-26) 15(0,-28) 16(0,-30) 17(0,-32) 18(0,-34) 19(0,-36) 20(0,-38) 21(0,-40) 22(0,-42) 23(0,-44) 24(0,-46) 25(0,-48) 26(0,-50) 27(0,-52) 28(0,-54) 29(0,-56) 30(0,-58) 31(0,-60) 32(0,-62) 33(0,-64) 34(0,-66) 35(0,-68) 36(0,-70) 37(0,-72) 38(0,-74) 39(0,-76) 40(0,-78)
F.SilkS:
  lines w0.12: -1.06,0 -1.06,1.06 0,1.06 ; -1.06,-79.06 -1.06,-1 1.06,-1 1.06,-79.06 -1.06,-79.06
F.CrtYd:
  lines w0.05: -1.5,-79.5 -1.5,1.5 1.5,1.5 1.5,-79.5 -1.5,-79.5
F.Fab:
  lines w0.1: -1,-79 1,-79 1,1 -0.5,1 -1,0.5 -1,-79
  text "'.Designator'" at 0.84,-43.047 h1

## PinHeader_1x40_P2.00mm_Vertical_SMD_Pin1Left [mm]
pads (40):
  rect 2.35x0.85 smd: 1(-1.175,39) 2(1.175,37) 3(-1.175,35) 4(1.175,33) 5(-1.175,31) 6(1.175,29) 7(-1.175,27) 8(1.175,25) 9(-1.175,23) 10(1.175,21) 11(-1.175,19) 12(1.175,17) 13(-1.175,15) 14(1.175,13) 15(-1.175,11) 16(1.175,9) 17(-1.175,7) 18(1.175,5) 19(-1.175,3) 20(1.175,1) 21(-1.175,-1) 22(1.175,-3) 23(-1.175,-5) 24(1.175,-7) 25(-1.175,-9) 26(1.175,-11) 27(-1.175,-13) 28(1.175,-15) 29(-1.175,-17) 30(1.175,-19) 31(-1.175,-21) 32(1.175,-23) 33(-1.175,-25) 34(1.175,-27) 35(-1.175,-29) 36(1.175,-31) 37(-1.175,-33) 38(1.175,-35) 39(-1.175,-37) 40(1.175,-39)
F.SilkS:
  lines w0.12: -2.29,39.685 -1.06,39.685 -1.06,40.06 1.06,40.06 1.06,37.685 ; -1.06,-37.685 -1.06,-40.06 1.06,-40.06 1.06,-39.685 ; -1.06,-36.315 -1.06,-33.685 ; -1.06,-32.315 -1.06,-29.685 ; -1.06,-28.315 -1.06,-25.685 ; -1.06,-24.315 -1.06,-21.685 ; -1.06,-20.315 -1.06,-17.685 ; -1.06,-16.315 -1.06,-13.685 ; -1.06,-12.315 -1.06,-9.685 ; -1.06,-8.315 -1.06,-5.685 ; -1.06,-4.315 -1.06,-1.685 ; -1.06,-0.315 -1.06,2.315 ; -1.06,3.685 -1.06,6.315 ; -1.06,7.685 -1.06,10.315 ; -1.06,11.685 -1.06,14.315 ; -1.06,15.685 -1.06,18.315 ; -1.06,19.685 -1.06,22.315 ; -1.06,23.685 -1.06,26.315 ; -1.06,27.685 -1.06,30.315 ; -1.06,31.685 -1.06,34.315 ; -1.06,35.685 -1.06,38.315 ; 1.06,-38.315 1.06,-35.685 ; 1.06,-34.315 1.06,-31.685 ; 1.06,-30.315 1.06,-27.685 ; 1.06,-26.315 1.06,-23.685 ; 1.06,-22.315 1.06,-19.685 ; 1.06,-18.315 1.06,-15.685 ; 1.06,-14.315 1.06,-11.685 ; 1.06,-10.315 1.06,-7.685 ; 1.06,-6.315 1.06,-3.685 ; 1.06,-2.315 1.06,0.315 ; 1.06,1.685 1.06,4.315 ; 1.06,5.685 1.06,8.315 ; 1.06,9.685 1.06,12.315 ; 1.06,13.685 1.06,16.315 ; 1.06,17.685 1.06,20.315 ; 1.06,21.685 1.06,24.315 ; 1.06,25.685 1.06,28.315 ; 1.06,29.685 1.06,32.315 ; 1.06,33.685 1.06,36.315
F.CrtYd:
  lines w0.05: -2.85,-40.5 -2.85,40.5 2.85,40.5 2.85,-40.5 -2.85,-40.5
F.Fab:
  lines w0.1: -1,-37.25 -2.1,-37.25 -2.1,-36.75 -1,-36.75 ; -1,-33.25 -2.1,-33.25 -2.1,-32.75 -1,-32.75 ; -1,-29.25 -2.1,-29.25 -2.1,-28.75 -1,-28.75 ; -1,-25.25 -2.1,-25.25 -2.1,-24.75 -1,-24.75 ; -1,-21.25 -2.1,-21.25 -2.1,-20.75 -1,-20.75 ; -1,-17.25 -2.1,-17.25 -2.1,-16.75 -1,-16.75 ; -1,-13.25 -2.1,-13.25 -2.1,-12.75 -1,-12.75 ; -1,-9.25 -2.1,-9.25 -2.1,-8.75 -1,-8.75 ; -1,-5.25 -2.1,-5.25 -2.1,-4.75 -1,-4.75 ; -1,-1.25 -2.1,-1.25 -2.1,-0.75 -1,-0.75 ; -1,2.75 -2.1,2.75 -2.1,3.25 -1,3.25 ; -1,6.75 -2.1,6.75 -2.1,7.25 -1,7.25 ; -1,10.75 -2.1,10.75 -2.1,11.25 -1,11.25 ; -1,14.75 -2.1,14.75 -2.1,15.25 -1,15.25 ; -1,18.75 -2.1,18.75 -2.1,19.25 -1,19.25 ; -1,22.75 -2.1,22.75 -2.1,23.25 -1,23.25 ; -1,26.75 -2.1,26.75 -2.1,27.25 -1,27.25 ; -1,30.75 -2.1,30.75 -2.1,31.25 -1,31.25 ; -1,34.75 -2.1,34.75 -2.1,35.25 -1,35.25 ; -1,38.75 -2.1,38.75 -2.1,39.25 -1,39.25 ; 1,-39.25 2.1,-39.25 2.1,-38.75 1,-38.75 ; 1,-35.25 2.1,-35.25 2.1,-34.75 1,-34.75 ; 1,-31.25 2.1,-31.25 2.1,-30.75 1,-30.75 ; 1,-27.25 2.1,-27.25 2.1,-26.75 1,-26.75 ; 1,-23.25 2.1,-23.25 2.1,-22.75 1,-22.75 ; 1,-19.25 2.1,-19.25 2.1,-18.75 1,-18.75 ; 1,-15.25 2.1,-15.25 2.1,-14.75 1,-14.75 ; 1,-11.25 2.1,-11.25 2.1,-10.75 1,-10.75 ; 1,-7.25 2.1,-7.25 2.1,-6.75 1,-6.75 ; 1,-3.25 2.1,-3.25 2.1,-2.75 1,-2.75 ; 1,0.75 2.1,0.75 2.1,1.25 1,1.25 ; 1,4.75 2.1,4.75 2.1,5.25 1,5.25 ; 1,8.75 2.1,8.75 2.1,9.25 1,9.25 ; 1,12.75 2.1,12.75 2.1,13.25 1,13.25 ; 1,16.75 2.1,16.75 2.1,17.25 1,17.25 ; 1,20.75 2.1,20.75 2.1,21.25 1,21.25 ; 1,24.75 2.1,24.75 2.1,25.25 1,25.25 ; 1,28.75 2.1,28.75 2.1,29.25 1,29.25 ; 1,32.75 2.1,32.75 2.1,33.25 1,33.25 ; 1,36.75 2.1,36.75 2.1,37.25 1,37.25 ; -1,39.25 -0.25,40 1,40 1,-40 -1,-40 -1,39.25
  text "'.Designator'" at 0.84,-4.047 h1

## PinHeader_1x40_P2.00mm_Vertical_SMD_Pin1Right [mm]
pads (40):
  rect 2.35x0.85 smd: 1(1.175,39) 2(-1.175,37) 3(1.175,35) 4(-1.175,33) 5(1.175,31) 6(-1.175,29) 7(1.175,27) 8(-1.175,25) 9(1.175,23) 10(-1.175,21) 11(1.175,19) 12(-1.175,17) 13(1.175,15) 14(-1.175,13) 15(1.175,11) 16(-1.175,9) 17(1.175,7) 18(-1.175,5) 19(1.175,3) 20(-1.175,1) 21(1.175,-1) 22(-1.175,-3) 23(1.175,-5) 24(-1.175,-7) 25(1.175,-9) 26(-1.175,-11) 27(1.175,-13) 28(-1.175,-15) 29(1.175,-17) 30(-1.175,-19) 31(1.175,-21) 32(-1.175,-23) 33(1.175,-25) 34(-1.175,-27) 35(1.175,-29) 36(-1.175,-31) 37(1.175,-33) 38(-1.175,-35) 39(1.175,-37) 40(-1.175,-39)
F.SilkS:
  lines w0.12: -1.06,-39.685 -1.06,-40.06 1.06,-40.06 1.06,-37.685 ; -1.06,-38.315 -1.06,-35.685 ; -1.06,-34.315 -1.06,-31.685 ; -1.06,-30.315 -1.06,-27.685 ; -1.06,-26.315 -1.06,-23.685 ; -1.06,-22.315 -1.06,-19.685 ; -1.06,-18.315 -1.06,-15.685 ; -1.06,-14.315 -1.06,-11.685 ; -1.06,-10.315 -1.06,-7.685 ; -1.06,-6.315 -1.06,-3.685 ; -1.06,-2.315 -1.06,0.315 ; -1.06,1.685 -1.06,4.315 ; -1.06,5.685 -1.06,8.315 ; -1.06,9.685 -1.06,12.315 ; -1.06,13.685 -1.06,16.315 ; -1.06,17.685 -1.06,20.315 ; -1.06,21.685 -1.06,24.315 ; -1.06,25.685 -1.06,28.315 ; -1.06,29.685 -1.06,32.315 ; -1.06,33.685 -1.06,36.315 ; -1.06,37.685 -1.06,40.06 1.06,40.06 1.06,39.685 2.29,39.685 ; 1.06,-36.315 1.06,-33.685 ; 1.06,-32.315 1.06,-29.685 ; 1.06,-28.315 1.06,-25.685 ; 1.06,-24.315 1.06,-21.685 ; 1.06,-20.315 1.06,-17.685 ; 1.06,-16.315 1.06,-13.685 ; 1.06,-12.315 1.06,-9.685 ; 1.06,-8.315 1.06,-5.685 ; 1.06,-4.315 1.06,-1.685 ; 1.06,-0.315 1.06,2.315 ; 1.06,3.685 1.06,6.315 ; 1.06,7.685 1.06,10.315 ; 1.06,11.685 1.06,14.315 ; 1.06,15.685 1.06,18.315 ; 1.06,19.685 1.06,22.315 ; 1.06,23.685 1.06,26.315 ; 1.06,27.685 1.06,30.315 ; 1.06,31.685 1.06,34.315 ; 1.06,35.685 1.06,38.315
F.CrtYd:
  lines w0.05: -2.85,-40.5 -2.85,40.5 2.85,40.5 2.85,-40.5 -2.85,-40.5
F.Fab:
  lines w0.1: -1,-39.25 -2.1,-39.25 -2.1,-38.75 -1,-38.75 ; -1,-35.25 -2.1,-35.25 -2.1,-34.75 -1,-34.75 ; -1,-31.25 -2.1,-31.25 -2.1,-30.75 -1,-30.75 ; -1,-27.25 -2.1,-27.25 -2.1,-26.75 -1,-26.75 ; -1,-23.25 -2.1,-23.25 -2.1,-22.75 -1,-22.75 ; -1,-19.25 -2.1,-19.25 -2.1,-18.75 -1,-18.75 ; -1,-15.25 -2.1,-15.25 -2.1,-14.75 -1,-14.75 ; -1,-11.25 -2.1,-11.25 -2.1,-10.75 -1,-10.75 ; -1,-7.25 -2.1,-7.25 -2.1,-6.75 -1,-6.75 ; -1,-3.25 -2.1,-3.25 -2.1,-2.75 -1,-2.75 ; -1,0.75 -2.1,0.75 -2.1,1.25 -1,1.25 ; -1,4.75 -2.1,4.75 -2.1,5.25 -1,5.25 ; -1,8.75 -2.1,8.75 -2.1,9.25 -1,9.25 ; -1,12.75 -2.1,12.75 -2.1,13.25 -1,13.25 ; -1,16.75 -2.1,16.75 -2.1,17.25 -1,17.25 ; -1,20.75 -2.1,20.75 -2.1,21.25 -1,21.25 ; -1,24.75 -2.1,24.75 -2.1,25.25 -1,25.25 ; -1,28.75 -2.1,28.75 -2.1,29.25 -1,29.25 ; -1,32.75 -2.1,32.75 -2.1,33.25 -1,33.25 ; -1,36.75 -2.1,36.75 -2.1,37.25 -1,37.25 ; 1,-37.25 2.1,-37.25 2.1,-36.75 1,-36.75 ; 1,-33.25 2.1,-33.25 2.1,-32.75 1,-32.75 ; 1,-29.25 2.1,-29.25 2.1,-28.75 1,-28.75 ; 1,-25.25 2.1,-25.25 2.1,-24.75 1,-24.75 ; 1,-21.25 2.1,-21.25 2.1,-20.75 1,-20.75 ; 1,-17.25 2.1,-17.25 2.1,-16.75 1,-16.75 ; 1,-13.25 2.1,-13.25 2.1,-12.75 1,-12.75 ; 1,-9.25 2.1,-9.25 2.1,-8.75 1,-8.75 ; 1,-5.25 2.1,-5.25 2.1,-4.75 1,-4.75 ; 1,-1.25 2.1,-1.25 2.1,-0.75 1,-0.75 ; 1,2.75 2.1,2.75 2.1,3.25 1,3.25 ; 1,6.75 2.1,6.75 2.1,7.25 1,7.25 ; 1,10.75 2.1,10.75 2.1,11.25 1,11.25 ; 1,14.75 2.1,14.75 2.1,15.25 1,15.25 ; 1,18.75 2.1,18.75 2.1,19.25 1,19.25 ; 1,22.75 2.1,22.75 2.1,23.25 1,23.25 ; 1,26.75 2.1,26.75 2.1,27.25 1,27.25 ; 1,30.75 2.1,30.75 2.1,31.25 1,31.25 ; 1,34.75 2.1,34.75 2.1,35.25 1,35.25 ; 1,38.75 2.1,38.75 2.1,39.25 1,39.25 ; 1,39.25 1,-40 -1,-40 -1,40 0.25,40 1,39.25
  text "'.Designator'" at 0.84,-4.047 h1

## PinHeader_2x01_P2.00mm_Horizontal [mm]
pads (2):
  rect 1.35x1.35 hole 0.8: 1(0,0)
  rrect100% 1.35x1.35 hole 0.8: 2(2,0)
F.SilkS:
  lines w0.12: -1,0 -1,1 0,1 ; 0.935,-0.31 1.118,-0.31 ; 0.935,0.31 1.118,0.31 ; 2.882,-0.31 3.44,-0.31 ; 2.882,0.31 3.44,0.31 ; 5.06,-0.31 9.26,-0.31 9.26,0.31 5.06,0.31 ; 5.06,-0.23 9.26,-0.23 ; 5.06,-0.11 9.26,-0.11 ; 5.06,0.01 9.26,0.01 ; 5.06,0.13 9.26,0.13 ; 5.06,0.25 9.26,0.25 ; 3.44,-1.06 5.06,-1.06 5.06,1.06 3.44,1.06 3.44,-1.06
F.CrtYd:
  lines w0.05: -1.5,-1.5 -1.5,1.5 9.7,1.5 9.7,-1.5 -1.5,-1.5
F.Fab:
  lines w0.1: 3.5,-0.25 -0.25,-0.25 -0.25,0.25 3.5,0.25 ; 5,-0.25 9.2,-0.25 9.2,0.25 5,0.25 ; 3.5,-1 3.5,0.625 3.875,1 5,1 5,-1 3.5,-1
  text "'.Designator'" at 5.006,-3.642 h0.9

## PinHeader_2x01_P2.00mm_Vertical [mm]
pads (2):
  rect 1.35x1.35 hole 0.8: 1(0,0)
  rrect100% 1.35x1.35 hole 0.8: 2(2,0)
F.SilkS:
  lines w0.12: -1.06,0 -1.06,1.06 0,1.06 ; -1.06,-1.06 -1.06,-1 1,-1 1,1.06 3.06,1.06 3.06,-1.06 -1.06,-1.06
F.CrtYd:
  lines w0.05: -1.5,-1.5 -1.5,1.5 3.5,1.5 3.5,-1.5 -1.5,-1.5
F.Fab:
  lines w0.1: -1,-1 3,-1 3,1 0,1 -1,0 -1,-1
  text "'.Designator'" at 1.84,-4.047 h1